# Altium footprint library alex_footprint.PcbLib: 262 footprints (part 10 of 17)
Each footprint in its own frame and in the unit in brackets; x right, y up, seen from the top. Pads: shape width x height; smd on the part's side, far side on the other; paste and mask are expansions set on the pad; w line width, h text height; cw(c..) or ccw(c..) is an arc to the next point about the centre after c.
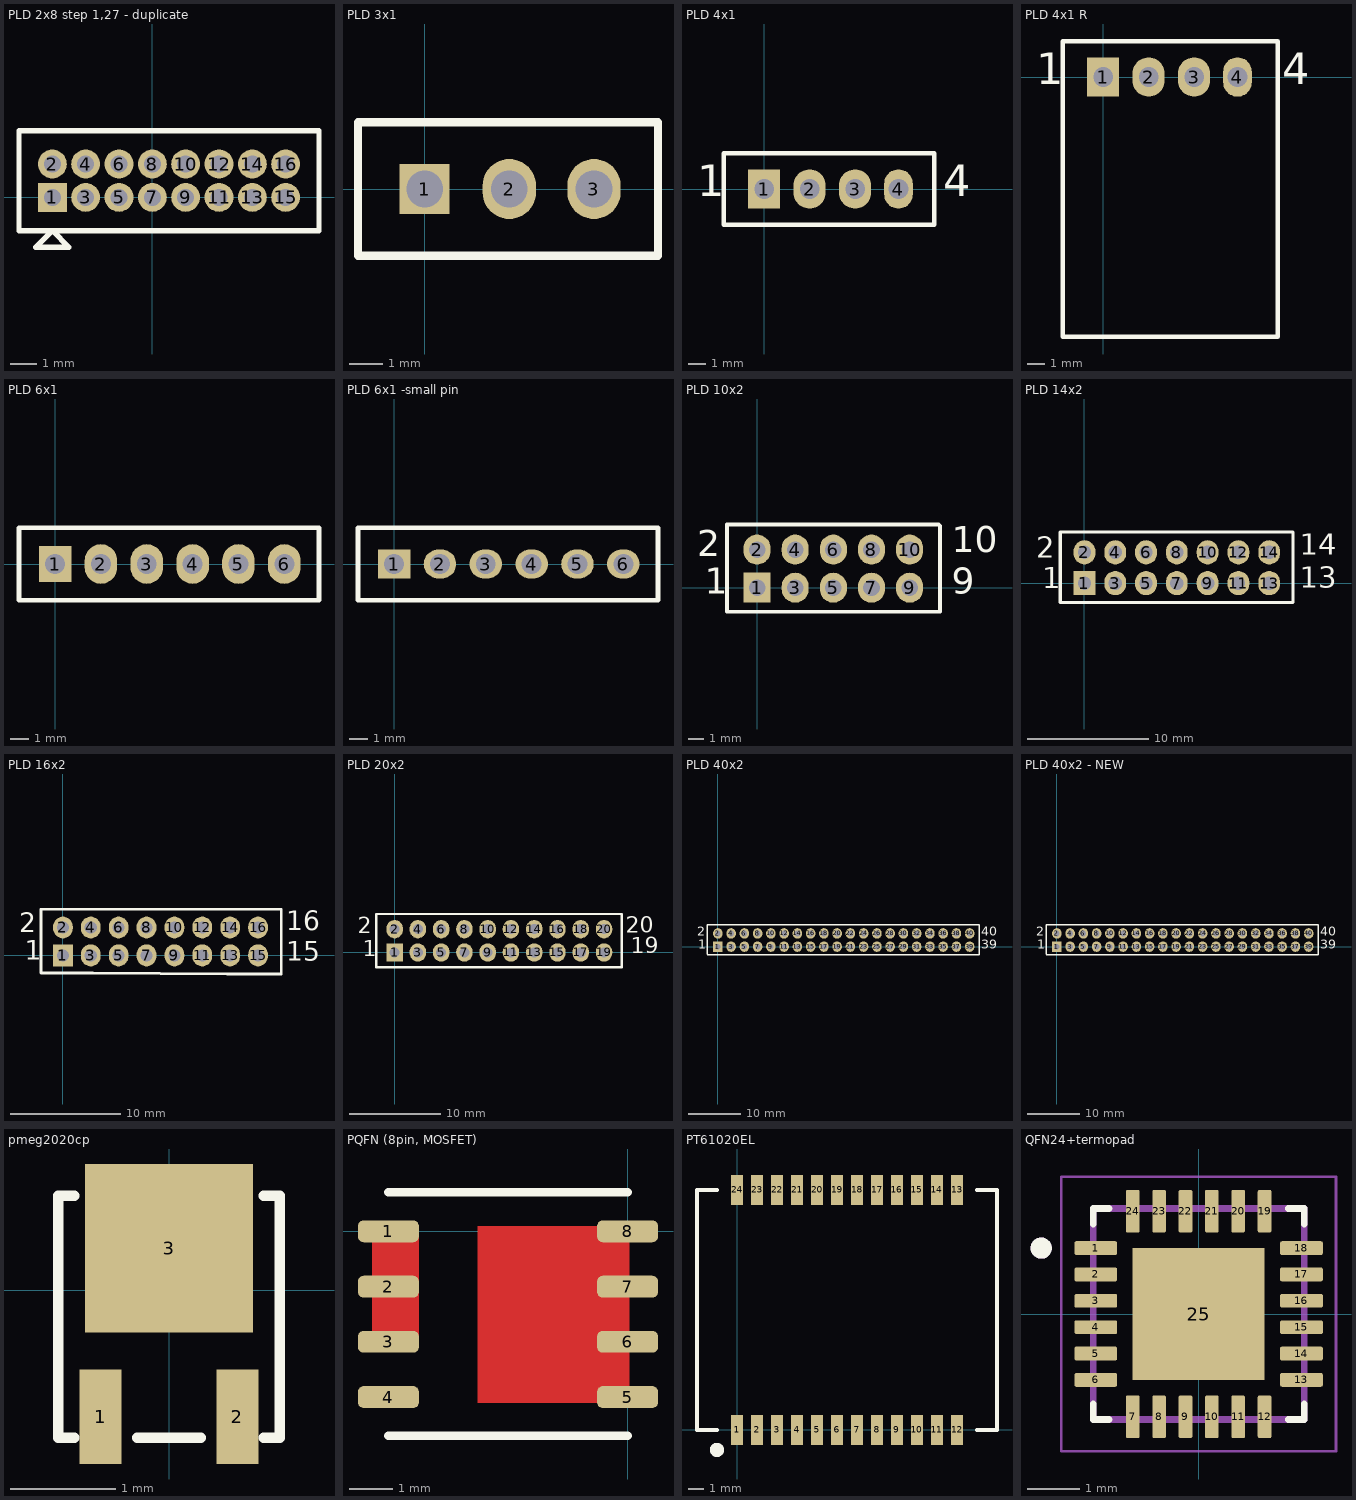
[diagram p9: the footprints below, top view; thin cyan lines are the x and y axes]

## PLD 2x8 step 1,27 - duplicate [mm]
pads (16):
  rect 1.1x1.1 hole 0.65 unplated mask+0.25: 1(-3.81,0)
  round 1.1 hole 0.65 unplated mask+0.25: 2(-3.81,1.27) 3(-2.54,0) 4(-2.54,1.27) 5(-1.27,0) 6(-1.27,1.27) 7(0,0) 8(0,1.27) 9(1.27,0) 10(1.27,1.27) 11(2.54,0) 12(2.54,1.27) 13(3.81,0) 14(3.81,1.27) 15(5.08,0) 16(5.08,1.27)
Top Overlay:
  lines w0.2: -5.08,-1.27 6.35,-1.27 6.35,2.54 -5.08,2.54 -5.08,-1.27 ; -4.445,-1.905 -3.81,-1.27 -3.175,-1.905 -4.445,-1.905
Top Solder:
  rectangle: -3.81,0 5.08,1.27
Bottom Solder:
  rectangle: -3.81,0 5.08,1.27

## PLD 3x1 [mm]
pads (3):
  rect 1.5x1.5 hole 1.1: 1(0,0)
  oval 1.6x1.8 hole 1.1: 2(2.54,0) 3(5.08,0)
Top Overlay:
  lines w0.254: -2,-2 -2,2 7,2 7,-2 -2,-2
Mechanical 7:
  text ".Designator" at 0,2.54 h1.5
3D body "DS1021-1_3SF11-B.stp": height 9.25, standoff -2.85, extent -1.27,-1.15 6.35,1.35

## PLD 4x1 [mm]
height 12
pads (4):
  rect 1.8x2.2 hole 1.1: 1(0,0)
  oval 1.8x2.2 hole 1.1: 2(2.54,0) 3(5.08,0)
  oval 1.6x2.2 hole 1.1 unplated: 4(7.5,0)
Top Overlay:
  lines w0.254: -2.25,-2 -2.25,2 9.5,2 9.5,-2 -2.25,-2
  text "4" at 10,-1 h3
  text "1" at -3.747,-1 h3
3D body "DS1021-1_4SF1-1.stp": height 8.5, standoff -3.1, extent -1.255,-1.215 8.905,1.325

## PLD 4x1 R [mm]
height 12
pads (4):
  rect 1.8x2.2 hole 1.1: 1(0,0)
  oval 1.8x2.2 hole 1.1: 2(2.54,0) 3(5.08,0)
  oval 1.6x2.2 hole 1.1 unplated: 4(7.5,0)
Top Overlay:
  lines w0.254: -2.25,-14.5 -2.25,2 9.75,2 9.75,-14.5 6.562,-14.5 0.687,-14.5 -2.25,-14.5
  text "4" at 10,-1 h3
  text "1" at -3.747,-1 h3

## PLD 6x1 [mm]
pads (6):
  rect 1.8x2 hole 1.1: 1(0,0)
  oval 1.8x2.2 hole 1.1: 2(2.54,0) 3(5.08,0) 4(7.62,0) 5(10.16,0) 6(12.7,0)
Top Overlay:
  lines w0.254: -2,-2 -2,2 14.62,2 14.62,-2 -2,-2
Mechanical 7:
  text ".Designator" at 0,2.54 h1.5
3D body "DS1021-1_3SF11-B.stp": height 9.25, standoff -2.85, extent 6.35,-1.15 13.97,1.35
3D body "DS1021-1_3SF11-B.stp": height 9.25, standoff -2.85, extent -1.27,-1.15 6.35,1.35

## PLD 6x1 -small pin [mm]
pads (6):
  rect 1.8x1.6 hole 1.1: 1(0,0)
  oval 1.8x1.6 hole 1.1: 2(2.54,0) 3(5.08,0) 4(7.62,0) 5(10.16,0) 6(12.7,0)
Top Overlay:
  lines w0.254: -2,-2 14.62,-2 14.62,2 -2,2 -2,-2
Mechanical 7:
  text ".Designator" at 0,2.54 h1.5
3D body "DS1021-1_3SF11-B.stp": height 9.25, standoff -2.85, extent -1.27,-1.15 6.35,1.35
3D body "DS1021-1_3SF11-B.stp": height 9.25, standoff -2.85, extent 6.35,-1.15 13.97,1.35

## PLD 10х2 [mm]
pads (10):
  rect 1.8x2 hole 1.1: 1(0,0)
  oval 1.8x2 hole 1.1: 2(0,2.54) 3(2.54,0) 4(2.54,2.54) 5(5.08,0) 6(5.08,2.54) 7(7.62,0) 8(7.62,2.54) 9(10.16,0) 10(10.16,2.54)
Top Overlay:
  lines w0.254: -2,-1.6 2.75,-1.6 12.175,-1.6 12.175,-0.175 12.175,2.675 12.175,4.1 12.075,4.2 2.75,4.2 -2,4.2 -2,-1.5
  text "2" at -4,1.5 h3
  text "1" at -3.497,-1 h3
  text "9" at 12.975,-0.992 h3
  text "10" at 12.978,1.758 h3
Mechanical 7:
  text ".Designator" at 4.1,4.9 h1.5

## PLD 14x2 [mm]
pads (14):
  rect 1.8x2 hole 1.1: 1(0,0)
  oval 1.8x2 hole 1.1: 2(0,2.54) 3(2.54,0) 4(2.54,2.54) 5(5.08,0) 6(5.08,2.54) 7(7.62,0) 8(7.62,2.54) 9(10.16,0) 10(10.16,2.54) 11(12.7,0) 12(12.7,2.54) 13(15.24,0) 14(15.24,2.54)
Top Overlay:
  lines w0.254: -2,-1.6 2.75,-1.6 12.25,-1.6 17.2,-1.6 ; -2,-1.5 -2,4.2 2.75,4.2 12.25,4.2 17.2,4.2 17.2,2.775 17.2,-0.075 17.2,-1.5
  text "2" at -4,1.5 h3
  text "1" at -3.497,-1 h3
  text "13" at 17.753,-0.967 h3
  text "14" at 17.753,1.75 h3
Mechanical 7:
  text ".Designator" at 4.1,4.9 h1.5

## PLD 16x2 [mm]
pads (16):
  rect 1.8x2 hole 1.1: 1(0,0)
  oval 1.8x2 hole 1.1: 2(0,2.54) 3(2.54,0) 4(2.54,2.54) 5(5.08,0) 6(5.08,2.54) 7(7.62,0) 8(7.62,2.54) 9(10.16,0) 10(10.16,2.54) 11(12.7,0) 12(12.7,2.54) 13(15.24,0) 14(15.24,2.54) 15(17.78,0) 16(17.78,2.54)
Top Overlay:
  lines w0.254: -2,-1.6 2.75,-1.6 14.95,-1.7 19.9,-1.7 ; -2,-1.5 -2,4.2 2.75,4.2 12.25,4.2 19.9,4.2 ; 19.9,-1.6 19.9,-0.175 19.9,2.675 19.9,4.1
  text "16" at 20.333,1.683 h3
  text "15" at 20.333,-1.067 h3
  text "1" at -3.497,-1 h3
  text "2" at -4,1.5 h3
Mechanical 7:
  text ".Designator" at 4.1,4.9 h1.5

## PLD 20x2 [mm]
pads (20):
  rect 1.8x2 hole 1.1: 1(0,0)
  oval 1.8x2 hole 1.1: 2(0,2.54) 3(2.54,0) 4(2.54,2.54) 5(5.08,0) 6(5.08,2.54) 7(7.62,0) 8(7.62,2.54) 9(10.16,0) 10(10.16,2.54) 11(12.7,0) 12(12.7,2.54) 13(15.24,0) 14(15.24,2.54) 15(17.78,0) 16(17.78,2.54) 17(20.32,0) 18(20.32,2.54) 19(22.86,0) 20(22.86,2.54)
Top Overlay:
  lines w0.254: -2,-1.6 2.75,-1.6 12.25,-1.6 17.2,-1.6 24.8,-1.6 24.8,4.2 17,4.2 ; -2,-1.5 -2,4.2 2.75,4.2 12.25,4.2 17.2,4.2
  text "2" at -4,1.5 h3
  text "1" at -3.497,-1 h3
  text "19" at 25.753,-0.717 h3
  text "20" at 25.25,1.533 h3

## PLD 40x2 [mm]
pads (40):
  rect 1.8x2 hole 1.1: 1(0,0)
  oval 1.8x2 hole 1.1: 2(0,2.54) 3(2.54,0) 4(2.54,2.54) 5(5.08,0) 6(5.08,2.54) 7(7.62,0) 8(7.62,2.54) 9(10.16,0) 10(10.16,2.54) 11(12.7,0) 12(12.7,2.54) 13(15.24,0) 14(15.24,2.54) 15(17.78,0) 16(17.78,2.54) 17(20.32,0) 18(20.32,2.54) 19(22.86,0) 20(22.86,2.54) 21(25.4,0) 22(25.4,2.54) 23(27.94,0) 24(27.94,2.54) 25(30.48,0) 26(30.48,2.54) 27(33.02,0) 28(33.02,2.54) 29(35.56,0) 30(35.56,2.54) 31(38.1,0) 32(38.1,2.54) 33(40.64,0) 34(40.64,2.54) 35(43.18,0) 36(43.18,2.54) 37(45.72,0) 38(45.72,2.54) 39(48.26,0) 40(48.26,2.54)
Top Overlay:
  lines w0.254: -2,-1.6 2.75,-1.6 12.25,-1.6 17.2,-1.6 50.1,-1.6 50.1,4.2 17,4.2 ; -2,-1.5 -2,4.2 2.75,4.2 12.25,4.2 17.2,4.2
  text "40" at 50.5,1.533 h3
  text "39" at 50.5,-0.967 h3
  text "1" at -3.747,-1 h3
  text "2" at -4,1.5 h3
Mechanical 7:
  text ".Designator" at 22.3,5.1 h1.5

## PLD 40x2 - NEW [mm]
pads (40):
  rect 1.8x2 hole 1.1: 1(0,0)
  oval 1.8x2 hole 1.1: 2(0,2.54) 3(2.54,0) 4(2.54,2.54) 5(5.08,0) 6(5.08,2.54) 7(7.62,0) 8(7.62,2.54) 9(10.16,0) 10(10.16,2.54) 11(12.7,0) 12(12.7,2.54) 13(15.24,0) 14(15.24,2.54) 15(17.78,0) 16(17.78,2.54) 17(20.32,0) 18(20.32,2.54) 19(22.86,0) 20(22.86,2.54) 21(25.4,0) 22(25.4,2.54) 23(27.94,0) 24(27.94,2.54) 25(30.48,0) 26(30.48,2.54) 27(33.02,0) 28(33.02,2.54) 29(35.56,0) 30(35.56,2.54) 31(38.1,0) 32(38.1,2.54) 33(40.64,0) 34(40.64,2.54) 35(43.18,0) 36(43.18,2.54) 37(45.72,0) 38(45.72,2.54) 39(48.26,0) 40(48.26,2.54)
Top Overlay:
  lines w0.254: -2,-1.6 2.75,-1.6 12.25,-1.6 17.2,-1.6 50.1,-1.6 50.1,4.2 17,4.2 ; -2,-1.5 -2,4.2 2.75,4.2 12.25,4.2 17.2,4.2
  text "2" at -4,1.5 h3
  text "1" at -3.747,-1 h3
  text "39" at 50.5,-0.967 h3
  text "40" at 50.5,1.533 h3
Mechanical 7:
  text ".Designator" at 22.3,5.1 h1.5

## pmeg2020cp [mm]
height 1
pads (3):
  rect 0.4x0.9 smd mask+0.051: 1(-0.65,-1.2) 2(0.65,-1.2)
  rect 1.6x1.6 smd paste-0.1 mask+0.051: 3(0,0.4)
Top Overlay:
  lines w0.1: -0.9,-1.4 -1.05,-1.4 -1.05,0.9 -0.9,0.9 ; -0.3,-1.4 0.3,-1.4 ; 0.9,-1.4 1.05,-1.4 1.05,0.9 0.9,0.9

## PQFN (8pin, MOSFET) [mm]
pads (8):
  rrect50% 1.4x0.5 smd mask+0.25: 1(-5.5,0) 2(-5.5,-1.27) 3(-5.5,-2.54) 4(-5.5,-3.81) 5(0,-3.81) 6(0,-2.54) 7(0,-1.27) 8(0,0)
Top Layer:
  rectangle: -5.875,-2.6 -4.8,0.05
  rectangle: -3.45,-3.95 0.05,0.125
Top Overlay:
  lines w0.2: -5.5,-4.7 0,-4.7 ; -5.5,0.9 0,0.9
Top Solder:
  rectangle: -6.1,-2.6 -4.6,0.1
  rectangle: -3.6,-4.2 0.3,0.3

## PT61020EL [mm]
height 5
pads (24):
  rect 0.76x1.91 smd: 1(0,0) 2(1.27,0) 3(2.54,0) 4(3.81,0) 5(5.08,0) 6(6.35,0) 7(7.62,0) 8(8.89,0) 9(10.16,0) 10(11.43,0) 11(12.7,0) 12(13.97,0) 13(13.97,15.24) 14(12.7,15.24) 15(11.43,15.24) 16(10.16,15.24) 17(8.89,15.24) 18(7.62,15.24) 19(6.35,15.24) 20(5.08,15.24) 21(3.81,15.24) 22(2.54,15.24) 23(1.27,15.24) 24(0,15.24)
Top Overlay:
  circle w0.5: c-1.27,-1.27 r0.2
  lines w0.254: -1.27,0 -2.54,0 -2.54,15.24 -1.27,15.24 ; 15.24,0 16.51,0 16.51,15.24 15.24,15.24

## QFN24+termopad [mm]
height 1
pads (25):
  rrect25% 0.81x0.26 smd: 1(-1.95,1.25) 2(-1.95,0.75) 3(-1.95,0.25) 4(-1.95,-0.25) 5(-1.95,-0.75) 6(-1.95,-1.25) 13(1.95,-1.25) 14(1.95,-0.75) 15(1.95,-0.25) 16(1.95,0.25) 17(1.95,0.75) 18(1.95,1.25)
  rrect25% 0.26x0.81 smd: 7(-1.25,-1.95) 8(-0.75,-1.95) 9(-0.25,-1.95) 10(0.25,-1.95) 11(0.75,-1.95) 12(1.25,-1.95) 19(1.25,1.95) 20(0.75,1.95) 21(0.25,1.95) 22(-0.25,1.95) 23(-0.75,1.95) 24(-1.25,1.95)
  rect 2.5x2.5 smd paste-0.46: 25(0,0)
Top Overlay:
  circle w0.2: c-2.985,1.25 r0.1
  lines w0.127: -2,-1.7 -2,-2 -1.7,-2 ; -2,1.7 -2,2 -1.7,2 ; 1.7,-2 2,-2 2,-1.7 ; 1.7,2 2,2 2,1.7
Mechanical 13:
  circle w0.2: c-2.985,1.25 r0.1
  lines w0.127: -2,-2 2,-2 2,2 -2,2 -2,-2
Mechanical 15:
  lines w0.05: -2.605,-2.605 2.605,-2.605 2.605,2.605 -2.605,2.605 -2.605,-2.605
3D body "step_temp.STEP": height 0.95, standoff -0.05, extent -2,-2 2,2